# Altium footprint library ref-packages.PCBLIB: 1543 footprints (part 32 of 103)
Each footprint in its own frame and in the unit in brackets; x right, y up, seen from the top. Pads: shape width x height; smd on the part's side, far side on the other; paste and mask are expansions set on the pad; w line width, h text height; cw(c..) or ccw(c..) is an arc to the next point about the centre after c.
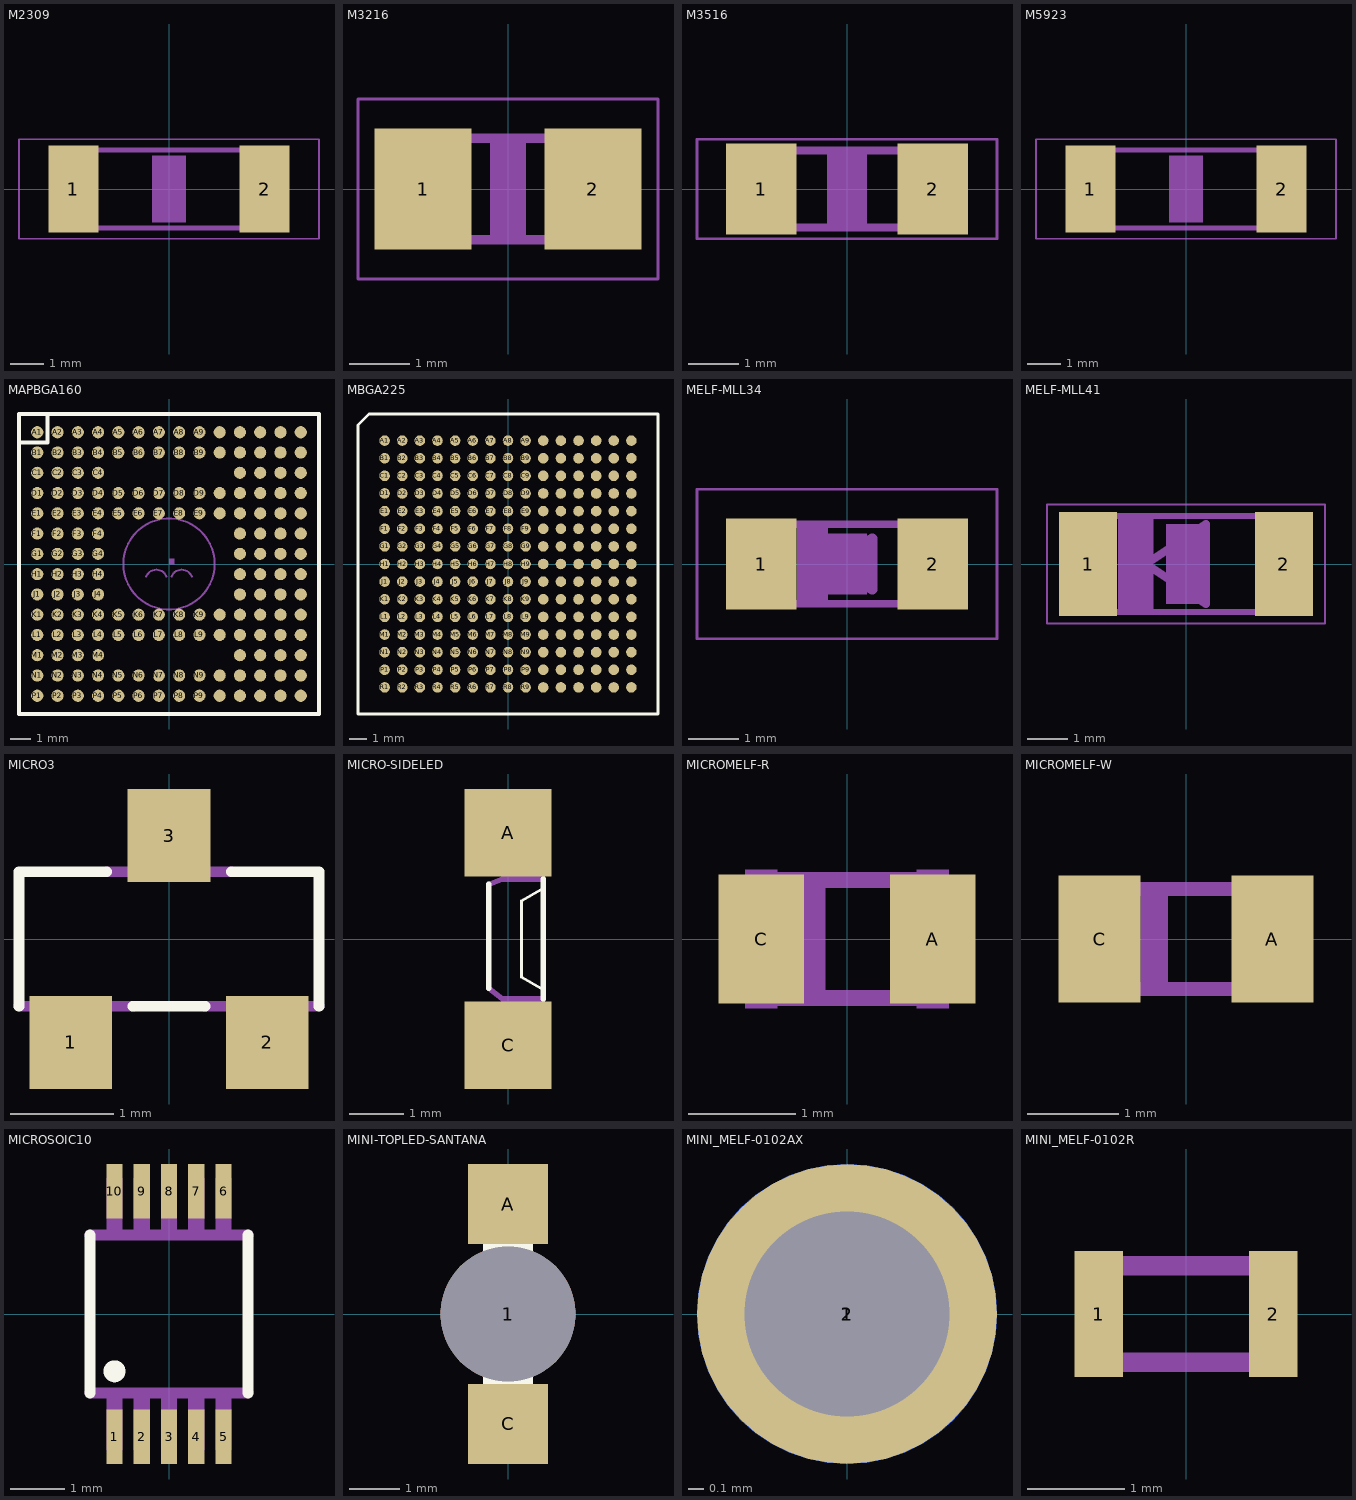
[diagram p31: the footprints below, top view; thin cyan lines are the x and y axes]

## M2309 [mil]
pads (2):
  rect 59.06x102.36 smd: 1(-112.2,0) 2(112.2,0)
Mechanical 6:
  rectangle: -19.69,-39.37 19.69,39.37
Mechanical 16:
  rectangle: -120,-49 -94,49
  rectangle: 94,-49 120,49
  lines w6: -96,46 95,46 ; -95,-46 95,-46
Mechanical 27:
  lines w2: -176.1,-58.39 176.1,-58.39 176.1,58.39 -176.1,58.39 -176.1,-58.39

## M3216 [mm]
pads (2):
  rect 1.6x2 smd: 1(-1.4,0) 2(1.4,0)
Mechanical 6:
  rectangle: -0.3,-0.8 0.3,0.8
Mechanical 16:
  rectangle: -1.702,-0.914 -1.118,0.914
  rectangle: 1.118,-0.914 1.702,0.914
  lines w0.152: -1.143,-0.838 1.143,-0.838 ; -1.143,0.838 1.143,0.838
Mechanical 27:
  lines w0.051: -2.473,-1.483 2.473,-1.483 2.473,1.483 -2.473,1.483 -2.473,-1.483

## M3516 [mil]
pads (2):
  rect 55.12x70.87 smd: 1(-66.93,0) 2(66.93,0)
Mechanical 6:
  rectangle: -15.75,-27.56 15.75,27.56
Mechanical 16:
  rectangle: -73,-33 -51,33
  rectangle: 51,-33 73,33
  lines w6: -52,-30 52,-30 ; -52,30 52,30
Mechanical 27:
  lines w2: -117.05,-38.7 117.05,-38.7 117.05,38.7 -117.05,38.7 -117.05,-38.7

## M5923 [mil]
pads (2):
  rect 59.06x102.36 smd: 1(-112.2,0) 2(112.2,0)
Mechanical 6:
  rectangle: -19.69,-39.37 19.69,39.37
Mechanical 16:
  rectangle: -120,-49 -94,49
  rectangle: 94,-49 120,49
  lines w6: -96,46 95,46 ; -95,-46 95,-46
Mechanical 27:
  lines w2: -176.1,-58.39 176.1,-58.39 176.1,58.39 -176.1,58.39 -176.1,-58.39

## MAPBGA160 [mil]
pads (160):
  rrect100% 23.62x23.62 smd: A1(-255.91,255.91) A2(-216.54,255.91) A3(-177.17,255.91) A4(-137.8,255.91) A5(-98.43,255.91) A6(-59.06,255.91) A7(-19.69,255.91) A8(19.69,255.91) A9(59.06,255.91) A10(98.43,255.91) A11(137.8,255.91) A12(177.17,255.91) A13(216.54,255.91) A14(255.91,255.91) B1(-255.91,216.54) B2(-216.54,216.54) B3(-177.17,216.54) B4(-137.8,216.54) B5(-98.43,216.54) B6(-59.06,216.54) B7(-19.69,216.54) B8(19.69,216.54) B9(59.06,216.54) B10(98.43,216.54) B11(137.8,216.54) B12(177.17,216.54) B13(216.54,216.54) B14(255.91,216.54) C1(-255.91,177.17) C2(-216.54,177.17) C3(-177.17,177.17) C4(-137.8,177.17) C11(137.8,177.17) C12(177.17,177.17) C13(216.54,177.17) C14(255.91,177.17) D1(-255.91,137.8) D2(-216.54,137.8) D3(-177.17,137.8) D4(-137.8,137.8) D5(-98.43,137.8) D6(-59.06,137.8) D7(-19.69,137.8) D8(19.69,137.8) D9(59.06,137.8) D10(98.43,137.8) D11(137.8,137.8) D12(177.17,137.8) D13(216.54,137.8) D14(255.91,137.8) E1(-255.91,98.43) E2(-216.54,98.43) E3(-177.17,98.43) E4(-137.8,98.43) E5(-98.43,98.43) E6(-59.06,98.43) E7(-19.69,98.43) E8(19.69,98.43) E9(59.06,98.43) E10(98.43,98.43) E11(137.8,98.43) E12(177.17,98.43) E13(216.54,98.43) E14(255.91,98.43) F1(-255.91,59.06) F2(-216.54,59.06) F3(-177.17,59.06) F4(-137.8,59.06) F11(137.8,59.06) F12(177.17,59.06) F13(216.54,59.06) F14(255.91,59.06) G1(-255.91,19.69) G2(-216.54,19.69) G3(-177.17,19.69) G4(-137.8,19.69) G11(137.8,19.69) G12(177.17,19.69) G13(216.54,19.69) G14(255.91,19.69) H1(-255.91,-19.69) H2(-216.54,-19.69) H3(-177.17,-19.69) H4(-137.8,-19.69) H11(137.8,-19.69) H12(177.17,-19.69) H13(216.54,-19.69) H14(255.91,-19.69) J1(-255.91,-59.06) J2(-216.54,-59.06) J3(-177.17,-59.06) J4(-137.8,-59.06) J11(137.8,-59.06) J12(177.17,-59.06) J13(216.54,-59.06) J14(255.91,-59.06) K1(-255.91,-98.43) K2(-216.54,-98.43) K3(-177.17,-98.43) K4(-137.8,-98.43) K5(-98.43,-98.43) K6(-59.06,-98.43) K7(-19.69,-98.43) K8(19.69,-98.43) K9(59.06,-98.43) K10(98.43,-98.43) K11(137.8,-98.43) K12(177.17,-98.43) K13(216.54,-98.43) K14(255.91,-98.43) L1(-255.91,-137.8) L2(-216.54,-137.8) L3(-177.17,-137.8) L4(-137.8,-137.8) L5(-98.43,-137.8) L6(-59.06,-137.8) L7(-19.69,-137.8) L8(19.69,-137.8) L9(59.06,-137.8) L10(98.43,-137.8) L11(137.8,-137.8) L12(177.17,-137.8) L13(216.54,-137.8) L14(255.91,-137.8) M1(-255.91,-177.17) M2(-216.54,-177.17) M3(-177.17,-177.17) M4(-137.8,-177.17) M11(137.8,-177.17) M12(177.17,-177.17) M13(216.54,-177.17) M14(255.91,-177.17) N1(-255.91,-216.54) N2(-216.54,-216.54) N3(-177.17,-216.54) N4(-137.8,-216.54) N5(-98.43,-216.54) N6(-59.06,-216.54) N7(-19.69,-216.54) N8(19.69,-216.54) N9(59.06,-216.54) N10(98.43,-216.54) N11(137.8,-216.54) N12(177.17,-216.54) N13(216.54,-216.54) N14(255.91,-216.54) P1(-255.91,-255.91) P2(-216.54,-255.91) P3(-177.17,-255.91) P4(-137.8,-255.91) P5(-98.43,-255.91) P6(-59.06,-255.91) P7(-19.69,-255.91) P8(19.69,-255.91) P9(59.06,-255.91) P10(98.43,-255.91) P11(137.8,-255.91) P12(177.17,-255.91) P13(216.54,-255.91) P14(255.91,-255.91)
Top Overlay:
  lines w8: -287.4,236.22 -236.22,236.22 -236.22,289.37 ; -291.34,-291.34 291.34,-291.34 291.34,291.34 -291.34,291.34 -291.34,-291.34
Mechanical 16:
  circle w4: c0,0 r88.58
  region: 0,0 10,0 10,10 0,10
  region: 0,0 10,0 10,10 0,10
  lines w4: -44.29,-24.61 cw(c-24.61,-31.99) -4.92,-24.61 ; 4.92,-24.61 cw(c24.61,-31.99) 44.29,-24.61

## MBGA225 [mm]
pads (225):
  rrect100% 0.6x0.6 smd: A1(-7,7) A2(-6,7) A3(-5,7) A4(-4,7) A5(-3,7) A6(-2,7) A7(-1,7) A8(0,7) A9(1,7) A10(2,7) A11(3,7) A12(4,7) A13(5,7) A14(6,7) A15(7,7) B1(-7,6) B2(-6,6) B3(-5,6) B4(-4,6) B5(-3,6) B6(-2,6) B7(-1,6) B8(0,6) B9(1,6) B10(2,6) B11(3,6) B12(4,6) B13(5,6) B14(6,6) B15(7,6) C1(-7,5) C2(-6,5) C3(-5,5) C4(-4,5) C5(-3,5) C6(-2,5) C7(-1,5) C8(0,5) C9(1,5) C10(2,5) C11(3,5) C12(4,5) C13(5,5) C14(6,5) C15(7,5) D1(-7,4) D2(-6,4) D3(-5,4) D4(-4,4) D5(-3,4) D6(-2,4) D7(-1,4) D8(0,4) D9(1,4) D10(2,4) D11(3,4) D12(4,4) D13(5,4) D14(6,4) D15(7,4) E1(-7,3) E2(-6,3) E3(-5,3) E4(-4,3) E5(-3,3) E6(-2,3) E7(-1,3) E8(0,3) E9(1,3) E10(2,3) E11(3,3) E12(4,3) E13(5,3) E14(6,3) E15(7,3) F1(-7,2) F2(-6,2) F3(-5,2) F4(-4,2) F5(-3,2) F6(-2,2) F7(-1,2) F8(0,2) F9(1,2) F10(2,2) F11(3,2) F12(4,2) F13(5,2) F14(6,2) F15(7,2) G1(-7,1) G2(-6,1) G3(-5,1) G4(-4,1) G5(-3,1) G6(-2,1) G7(-1,1) G8(0,1) G9(1,1) G10(2,1) G11(3,1) G12(4,1) G13(5,1) G14(6,1) G15(7,1) H1(-7,0) H2(-6,0) H3(-5,0) H4(-4,0) H5(-3,0) H6(-2,0) H7(-1,0) H8(0,0) H9(1,0) H10(2,0) H11(3,0) H12(4,0) H13(5,0) H14(6,0) H15(7,0) J1(-7,-1) J2(-6,-1) J3(-5,-1) J4(-4,-1) J5(-3,-1) J6(-2,-1) J7(-1,-1) J8(0,-1) J9(1,-1) J10(2,-1) J11(3,-1) J12(4,-1) J13(5,-1) J14(6,-1) J15(7,-1) K1(-7,-2) K2(-6,-2) K3(-5,-2) K4(-4,-2) K5(-3,-2) K6(-2,-2) K7(-1,-2) K8(0,-2) K9(1,-2) K10(2,-2) K11(3,-2) K12(4,-2) K13(5,-2) K14(6,-2) K15(7,-2) L1(-7,-3) L2(-6,-3) L3(-5,-3) L4(-4,-3) L5(-3,-3) L6(-2,-3) L7(-1,-3) L8(0,-3) L9(1,-3) L10(2,-3) L11(3,-3) L12(4,-3) L13(5,-3) L14(6,-3) L15(7,-3) M1(-7,-4) M2(-6,-4) M3(-5,-4) M4(-4,-4) M5(-3,-4) M6(-2,-4) M7(-1,-4) M8(0,-4) M9(1,-4) M10(2,-4) M11(3,-4) M12(4,-4) M13(5,-4) M14(6,-4) M15(7,-4) N1(-7,-5) N2(-6,-5) N3(-5,-5) N4(-4,-5) N5(-3,-5) N6(-2,-5) N7(-1,-5) N8(0,-5) N9(1,-5) N10(2,-5) N11(3,-5) N12(4,-5) N13(5,-5) N14(6,-5) N15(7,-5) P1(-7,-6) P2(-6,-6) P3(-5,-6) P4(-4,-6) P5(-3,-6) P6(-2,-6) P7(-1,-6) P8(0,-6) P9(1,-6) P10(2,-6) P11(3,-6) P12(4,-6) P13(5,-6) P14(6,-6) P15(7,-6) R1(-7,-7) R2(-6,-7) R3(-5,-7) R4(-4,-7) R5(-3,-7) R6(-2,-7) R7(-1,-7) R8(0,-7) R9(1,-7) R10(2,-7) R11(3,-7) R12(4,-7) R13(5,-7) R14(6,-7) R15(7,-7)
Top Overlay:
  lines w0.152: -8.509,-8.509 8.509,-8.509 8.509,8.509 -7.874,8.509 -8.509,7.874 -8.509,-8.509

## MELF-MLL34 [mil]
pads (2):
  rect 55.12x70.87 smd: 1(-66.93,0) 2(66.93,0)
Mechanical 6:
  rectangle: -19.69,-23.62 15.75,23.62
Mechanical 16:
  rectangle: -73,-34 -51,34
  rectangle: 51,-34 73,34
  rectangle: -39,-31 -15,31
  lines w6: -52,-31 52,-31 ; -52,31 52,31
  lines w8: -19.69,0 19.69,19.69 19.69,-19.69 -19.69,0
Mechanical 27:
  lines w2: -117.05,-58.39 117.05,-58.39 117.05,58.39 -117.05,58.39 -117.05,-58.39

## MELF-MLL41 [mm]
pads (2):
  rect 1.45x2.6 smd: 1(-2.445,0) 2(2.445,0)
Mechanical 6:
  rectangle: -0.5,-1 0.5,1
Mechanical 16:
  rectangle: 2.057,-1.27 2.565,1.27
  rectangle: -2.616,-1.27 -2.108,1.27
  rectangle: -1.702,-1.194 -0.813,1.194
  lines w0.152: -2.159,1.194 2.083,1.194 ; -2.134,-1.194 2.083,-1.194
  lines w0.203: -1,0 0.5,1 0.5,-1 -1,0
Mechanical 27:
  lines w0.051: -3.473,-1.483 3.473,-1.483 3.473,1.483 -3.473,1.483 -3.473,-1.483

## MICRO3 [mil]
pads (3):
  rect 31.5x35.43 smd: 1(-37.4,-39.37) 2(37.4,-39.37) 3(0,39.37)
Top Overlay:
  lines w4: -57.09,-25.59 -57.09,25.59 -23.62,25.59 ; -13.78,-25.59 13.78,-25.59 ; 23.62,25.59 57.09,25.59 57.09,-25.59
Mechanical 16:
  rectangle: -10.63,25.98 10.63,49.21
  rectangle: -48.03,-49.21 -26.77,-25.59
  rectangle: 26.77,-49.21 48.03,-25.2
  lines w4: -57.09,-25.59 -13.78,-25.59 ; -23.62,25.59 23.62,25.59 ; 13.78,-25.59 57.09,-25.59

## MICRO-SIDELED [mil]
pads (2):
  rect 62.99x62.99 smd: A(0,76.77) C(0,-76.77)
Top Overlay:
  lines w2: 23.62,-35.43 9.84,-27.56 9.84,27.56 23.62,35.43
  lines w4: -13.78,-35.43 -13.78,39.37 ; 25.59,-43.31 25.59,43.31
Top Paste:
  rectangle: -13.78,-68.9 13.78,-45.28
  rectangle: -13.78,45.28 13.78,68.9
Top Solder:
  rectangle: -15.75,43.31 15.75,70.87
  rectangle: -15.75,-70.87 15.75,-43.31
Mechanical 16:
  rectangle: -4.92,44.29 4.92,68.9
  rectangle: -4.92,-68.9 4.92,-44.29
  lines w4: -13.78,-35.43 -3.94,-43.31 25.59,-43.31 ; -13.78,39.37 -3.94,43.31 25.59,43.31

## MICROMELF-R [mil]
pads (2):
  rect 31.5x47.24 smd: A(31.5,0) C(-31.5,0)
Mechanical 16:
  rectangle: -37.4,-25.59 -25.59,25.59
  rectangle: 25.59,-25.59 37.4,25.59
  rectangle: -19.69,-21.65 -7.87,21.65
  lines w6: -25.59,-21.65 25.59,-21.65 ; -25.59,21.65 25.59,21.65

## MICROMELF-W [mil]
pads (2):
  rect 35.43x55.12 smd: A(37.4,0) C(-37.4,0)
Mechanical 16:
  rectangle: -37.4,-25.59 -25.59,25.59
  rectangle: 25.59,-25.59 37.4,25.59
  rectangle: -19.69,-19.69 -7.87,21.65
  lines w6: -25.59,-21.65 25.59,-21.65 ; -25.59,21.65 25.59,21.65

## MICROSOIC10 [mm]
pads (10):
  rect 0.3x1 smd: 1(-1,-2.25) 2(-0.5,-2.25) 3(0,-2.25) 4(0.5,-2.25) 5(1,-2.25) 6(1,2.25) 7(0.5,2.25) 8(0,2.25) 9(-0.5,2.25) 10(-1,2.25)
Top Overlay:
  circle w0.203: c-1,-1.05 r0.1
  lines w0.203: -1.45,-1.45 -1.45,1.45 ; 1.45,-1.45 1.45,1.45
Mechanical 16:
  rectangle: -1.15,-2.5 -0.85,-1.5
  rectangle: -0.65,-2.5 -0.35,-1.5
  rectangle: -0.15,-2.5 0.15,-1.5
  rectangle: 0.35,-2.5 0.65,-1.5
  rectangle: 0.85,-2.5 1.15,-1.5
  rectangle: 0.85,1.5 1.15,2.5
  rectangle: 0.35,1.5 0.65,2.5
  rectangle: -0.15,1.5 0.15,2.5
  rectangle: -0.65,1.5 -0.35,2.5
  rectangle: -1.15,1.5 -0.85,2.5
  lines w0.203: -1.45,-1.45 1.45,-1.45 ; -1.45,1.45 1.45,1.45

## MINI-TOPLED-SANTANA [mil]
pads (3):
  round 106.3 hole 106.3: 1(0,0)
  rect 62.99x62.99 smd: A(0,86.61) C(0,-86.61)
Top Overlay:
  rectangle: -7.87,-15.75 5.91,-1.97
  rectangle: -19.69,39.37 19.69,55.12
  rectangle: -19.69,-55.12 19.69,-41.34
  lines w4: 13.78,-39.37 27.56,-39.37 27.56,-25.59 ; 13.78,-39.37 -27.56,-39.37 -27.56,39.37 27.56,39.37 27.56,-25.59 ; 13.78,-39.37 27.56,-25.59 ; -17.72,-27.56 17.72,-27.56 17.72,27.56 -17.72,27.56 -17.72,-27.56
Top Paste:
  rectangle: -19.69,-80.71 19.69,-61.02
  rectangle: -19.69,61.02 19.69,80.71
Top Solder:
  rectangle: -21.65,59.06 21.65,82.68
  rectangle: -21.65,-82.68 21.65,-59.06
Mechanical 16:
  rectangle: -19.69,-82.68 19.69,-55.12
  rectangle: -19.69,55.12 19.69,80.71

## MINI_MELF-0102AX [mil]
pads (3):
  rrect100% 74.8x74.8 smd: 1(0,0)
  round 51.18 hole 51.18: 1(0,0)
  rrect100% 74.8x74.8 smd far side: 2(0,0)
Mechanical 16:
  circle w0: c0,0 r23.62
Mechanical 30:
  circle w0: c0,0 r23.62

## MINI_MELF-0102R [mil]
pads (2):
  rect 19.69x51.18 smd: 1(-35.43,0) 2(35.43,0)
Mechanical 16:
  lines w8: -39.37,-19.69 39.37,-19.69 39.37,19.69 -39.37,19.69 -39.37,-19.69